# Altium footprint library Inductor.PcbLib: 75 footprints (part 4 of 5)
Each footprint in its own frame and in the unit in brackets; x right, y up, seen from the top. Pads: shape width x height; smd on the part's side, far side on the other; paste and mask are expansions set on the pad; w line width, h text height; cw(c..) or ccw(c..) is an arc to the next point about the centre after c.
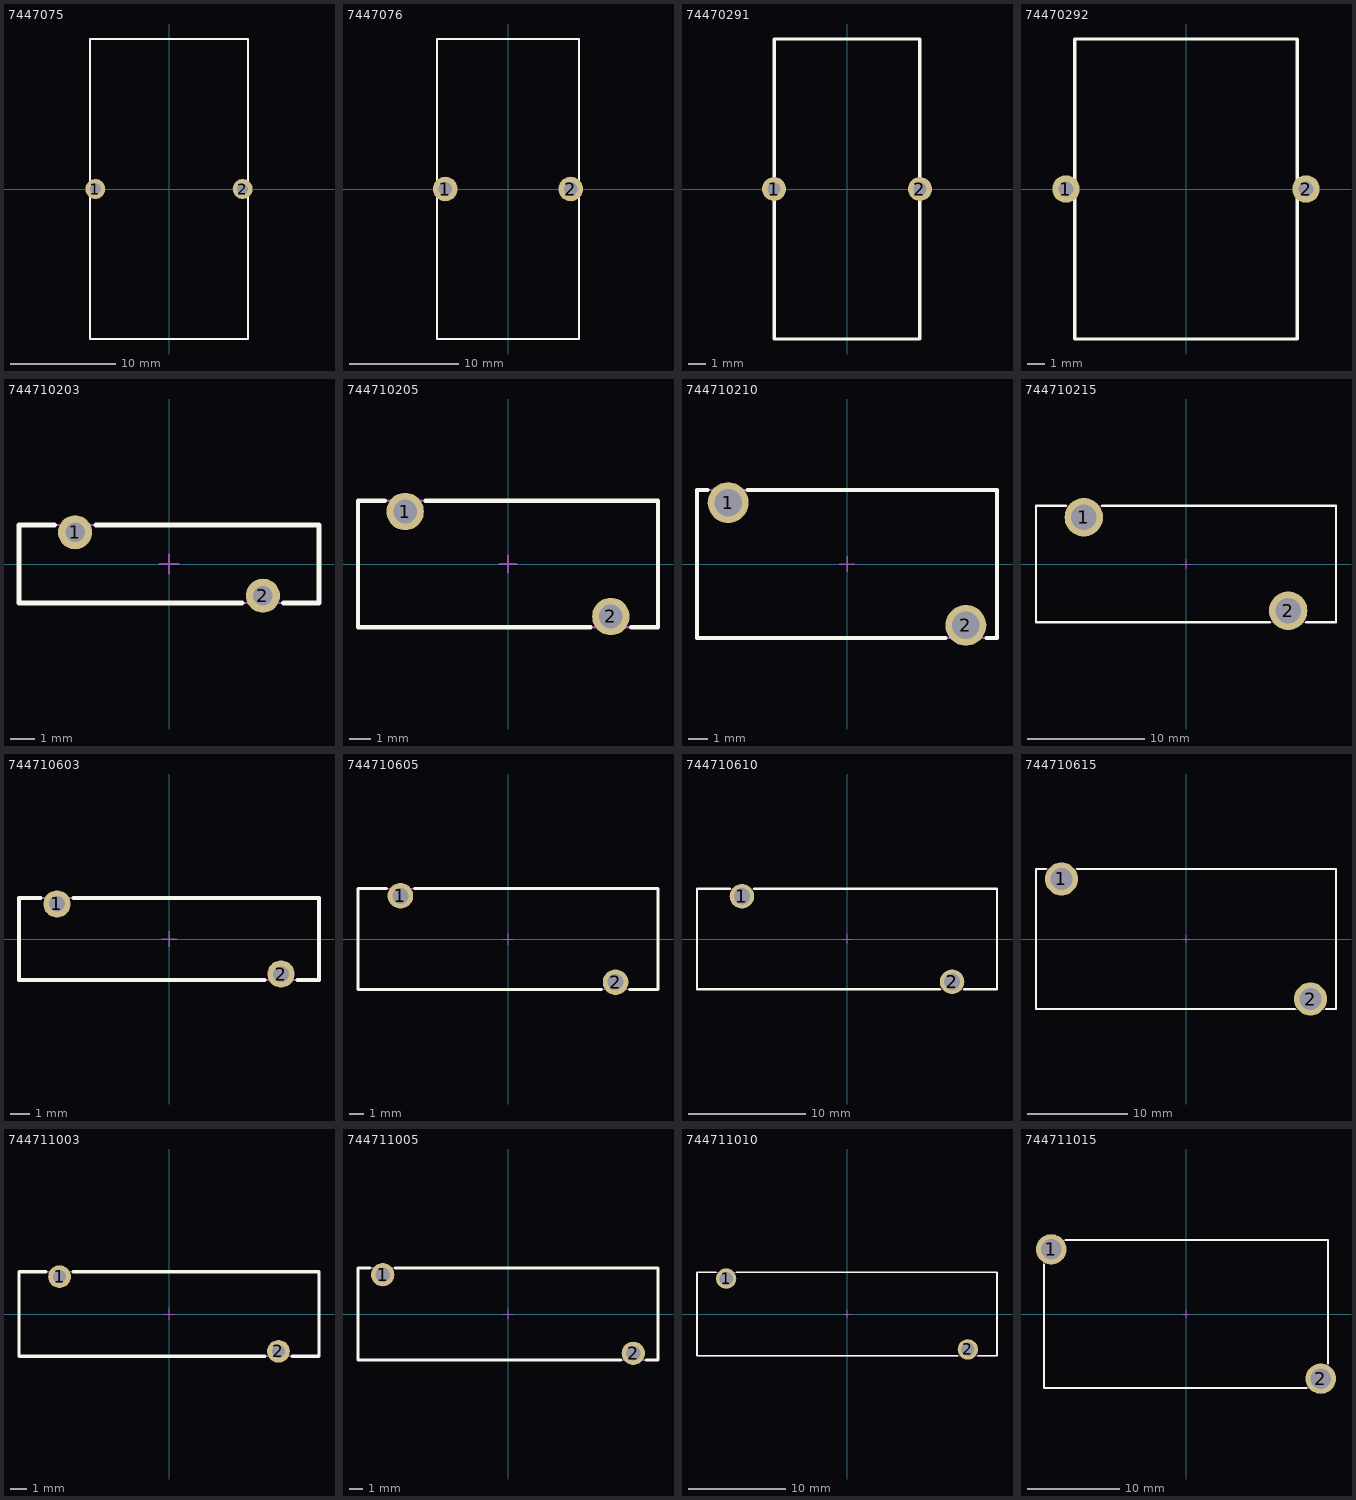
[diagram p3: the footprints below, top view; thin cyan lines are the x and y axes]

## 7447075 [mm] "Body 28.5x15mm, 2 leads"
height 28.5
pads (2):
  round 1.9 hole 1.05: 1(-7,0) 2(7,0)
Top Overlay:
  lines w0.2: -7.5,-14.25 7.5,-14.25 7.5,14.25 -7.5,14.25 -7.5,-14.25
3D body "7447075.stp": height 30.65, standoff -23.75, extent -8.42,-15.164 8.42,15.163

## 7447076 [mm] "Body 27.5x13mm, 2 leads"
height 27.5
pads (2):
  round 2.25 hole 1.25: 1(-5.75,0) 2(5.75,0)
Top Overlay:
  lines w0.2: -6.5,-13.75 -6.5,13.75 6.5,13.75 6.5,-13.75 -6.5,-13.75
3D body "7447076.stp": height 28.22, standoff -11.95, extent -6.5,-13.741 6.5,13.744

## 74470291 [mm] "Body 17.5x8.5mm, 2 leads"
height 17.5
pads (2):
  round 1.4 hole 0.75: 1(-4.25,0) 2(4.25,0)
Top Overlay:
  lines w0.2: -4.25,-8.75 4.25,-8.75 4.25,8.75 -4.25,8.75 -4.25,-8.75
3D body "74470291.stp": height 18.8, standoff -24.25, extent -4.82,-9.315 4.82,9.315

## 74470292 [mm] "Body 17.5x13mm, 2 leads"
height 17.5
pads (2):
  round 1.6 hole 0.85: 1(-7,0) 2(7,0)
Top Overlay:
  lines w0.2: -6.5,-8.75 -6.5,8.75 6.5,8.75 6.5,-8.75 -6.5,-8.75
3D body "74470292.stp": height 18.85, standoff -19.25, extent -7.12,-9.365 7.12,9.365

## 744710203 [mm] "Rod Core Choke, THT, 2-leads"
height 3.2
pads (2):
  round 1.4 hole 0.8: 1(-3.85,1.3) 2(3.85,-1.3)
Top Overlay:
  lines w0.2: -6.15,1.598 -6.15,-1.6 3,-1.6 ; -6.15,1.598 -4.701,1.598 ; -3,1.598 6.15,1.598 ; 4.7,-1.6 6.15,-1.6 6.15,1.598
Mechanical 13:
  lines w0.1: -6.15,-1.6 -6.15,1.6 6.15,1.6 6.15,-1.6 -6.15,-1.6
Mechanical 15:
  lines w0.076: -0.4,0 0.4,0 ; 0,-0.4 0,0.4
3D body "744710203.stp": height 3.25, standoff -2.95, extent -6.15,-1.6 6.15,1.598

## 744710205 [mm] "Rod Core Choke, THT, 2-leads"
height 5.9
pads (2):
  round 1.75 hole 1.1: 1(-4.8,2.45) 2(4.8,-2.45)
Top Overlay:
  lines w0.2: -5.75,2.95 -7,2.95 -7,-2.95 3.85,-2.95 ; -3.85,2.95 7,2.95 7,-2.95 5.75,-2.95
Mechanical 13:
  lines w0.1: -7,-2.95 7,-2.95 7,2.95 -7,2.95 -7,-2.95
Mechanical 15:
  lines w0.076: -0.4,0 0.4,0 ; 0,-0.4 0,0.4
3D body "744710205.stp": height 5.94, standoff -2.95, extent -7,-2.949 7,2.947

## 744710210 [mm] "Rod Core Choke, THT, 2-leads"
height 7.6
pads (2):
  round 2.1 hole 1.4: 1(-6.1,3.15) 2(6.1,-3.15)
Top Overlay:
  lines w0.2: -7.15,3.8 -7.7,3.8 -7.7,-3.8 5.05,-3.8 ; -5.1,3.8 7.7,3.8 7.7,-3.8 7.15,-3.8
Mechanical 13:
  lines w0.1: -7.7,-3.8 -7.7,3.8 7.7,3.8 7.7,-3.8 -7.7,-3.8
Mechanical 15:
  lines w0.076: -0.4,0 0.4,0 ; 0,-0.4 0,0.4
3D body "744710210.stp": height 7.65, standoff -2.95, extent -7.7,-3.8 7.7,3.798

## 744710215 [mm] "Rod Core Choke, THT, 2-leads"
height 10
pads (2):
  round 3.3 hole 2.2: 1(-8.75,4) 2(8.75,-4)
Top Overlay:
  lines w0.2: -10.3,5 -12.85,5 -12.85,-5 7.2,-5 ; -7.2,5 12.85,5 12.85,-5 10.3,-5
Mechanical 13:
  lines w0.1: -12.85,-5 12.85,-5 12.85,5 -12.85,5 -12.85,-5
Mechanical 15:
  lines w0.076: -0.4,0 0.4,0 ; 0,-0.4 0,0.4
3D body "744710215.stp": height 10.04, standoff -2.95, extent -12.85,-5.001 12.85,4.996

## 744710603 [mm] "Rod Core Choke, THT, 2-leads"
height 4.2
pads (2):
  round 1.4 hole 0.8: 1(-5.75,1.8) 2(5.75,-1.8)
Top Overlay:
  lines w0.2: -6.6,2.1 -7.7,2.1 -7.7,-2.1 4.9,-2.1 ; -4.9,2.1 7.7,2.1 7.7,-2.1 6.6,-2.1
Mechanical 13:
  lines w0.1: -7.7,-2.1 -7.7,2.1 7.7,2.1 7.7,-2.1 -7.7,-2.1
Mechanical 15:
  lines w0.076: -0.4,0 0.4,0 ; 0,-0.4 0,0.4
3D body "744710603.stp": height 4.25, standoff -2.95, extent -7.7,-2.1 7.7,2.1

## 744710605 [mm] "Rod Core Choke, THT, 2-leads"
height 6.9
pads (2):
  round 1.75 hole 1.1: 1(-7.35,2.95) 2(7.35,-2.95)
Top Overlay:
  lines w0.2: -8.3,3.45 -10.25,3.45 -10.25,-3.45 6.4,-3.45 ; -6.4,3.45 10.25,3.45 10.25,-3.45 8.3,-3.45
Mechanical 13:
  lines w0.1: -10.25,-3.45 10.25,-3.45 10.25,3.45 -10.25,3.45 -10.25,-3.45
Mechanical 15:
  lines w0.076: -0.4,0 0.4,0 ; 0,-0.4 0,0.4
3D body "744710605.stp": height 6.94, standoff -2.95, extent -10.25,-3.45 10.25,3.449

## 744710610 [mm] "Rod Core Choke, THT, 2-leads"
height 8.6
pads (2):
  round 2.1 hole 1.4: 1(-9,3.65) 2(9,-3.65)
Top Overlay:
  lines w0.2: -10.05,4.3 -12.85,4.3 -12.85,-4.3 7.95,-4.3 ; -7.95,4.3 12.85,4.3 12.85,-4.3 10.05,-4.3
Mechanical 13:
  lines w0.1: -12.85,-4.3 12.85,-4.3 12.85,4.3 -12.85,4.3 -12.85,-4.3
Mechanical 15:
  lines w0.076: -0.4,0 0.4,0 ; 0,-0.4 0,0.4
3D body "744710610.stp": height 8.65, standoff -2.95, extent -12.85,-4.3 12.85,4.3

## 744710615 [mm] "Rod Core Choke, THT, 2-leads"
height 14
pads (2):
  round 3.3 hole 2.2: 1(-12.45,6) 2(12.45,-6)
Top Overlay:
  lines w0.2: -14,7 -15,7 -15,-7 10.9,-7 ; -10.9,7 15,7 15,-7 14,-7
Mechanical 13:
  lines w0.1: -15,-7 -15,7 15,7 15,-7 -15,-7
Mechanical 15:
  lines w0.076: -0.4,0 0.4,0 ; 0,-0.4 0,0.4
3D body "744710615.stp": height 14.59, standoff -2.4, extent -15,-7 15,6.995

## 744711003 [mm] "Rod Core Choke, THT, 2-leads"
height 5.2
pads (2):
  round 1.4 hole 0.8: 1(-6.75,2.3) 2(6.75,-2.3)
Top Overlay:
  lines w0.2: -7.6,2.6 -9.25,2.6 -9.25,-2.6 5.9,-2.6 ; -5.9,2.6 9.25,2.6 9.25,-2.6 7.6,-2.6
Mechanical 13:
  lines w0.1: -9.25,-2.6 9.25,-2.6 9.25,2.6 -9.25,2.6 -9.25,-2.6
Mechanical 15:
  lines w0.076: -0.4,0 0.4,0 ; 0,-0.4 0,0.4
3D body "744711003.stp": height 5.25, standoff -2.95, extent -9.25,-2.6 9.25,2.6

## 744711005 [mm] "Rod Core Choke, THT, 2-leads"
height 6.9
pads (2):
  round 1.75 hole 1.1: 1(-9.4,2.95) 2(9.4,-2.95)
Top Overlay:
  lines w0.2: -10.35,3.45 -11.25,3.45 -11.25,-3.45 8.45,-3.45 ; -8.45,3.45 11.25,3.45 11.25,-3.45 10.35,-3.45
Mechanical 13:
  lines w0.1: -11.25,-3.45 -11.25,3.45 11.25,3.45 11.25,-3.45 -11.25,-3.45
Mechanical 15:
  lines w0.076: -0.4,0 0.4,0 ; 0,-0.4 0,0.4
3D body "744711005.stp": height 6.95, standoff -2.95, extent -11.25,-3.45 11.25,3.45

## 744711010 [mm] "Rod Core Choke, THT, 2-leads"
height 8.6
pads (2):
  round 2.1 hole 1.4: 1(-12.45,3.65) 2(12.45,-3.65)
Top Overlay:
  lines w0.2: -13.5,4.3 -15.45,4.3 -15.45,-4.3 11.4,-4.3 ; -11.4,4.3 15.45,4.3 15.45,-4.3 13.5,-4.3
Mechanical 13:
  lines w0.1: -15.45,-4.3 15.45,-4.3 15.45,4.3 -15.45,4.3 -15.45,-4.3
Mechanical 15:
  lines w0.076: -0.4,0 0.4,0 ; 0,-0.4 0,0.4
3D body "744711010.stp": height 8.65, standoff -2.95, extent -15.45,-4.3 15.45,4.3

## 744711015 [mm] "Rod Core Choke, THT, 2-leads"
height 16
pads (2):
  round 3.3 hole 2.2: 1(-14.6,7) 2(14.6,-7)
Top Overlay:
  lines w0.2: -15.4,5.35 -15.4,-8 13.05,-8 ; -13.05,8 15.4,8 15.4,-5.35
Mechanical 13:
  lines w0.1: -15.4,-8 15.4,-8 15.4,8 -15.4,8 -15.4,-8
Mechanical 15:
  lines w0.076: -0.4,0 0.4,0 ; 0,-0.4 0,0.4
3D body "744711015.stp": height 16.02, standoff -2.95, extent -15.4,-8 15.498,8